# Altium footprint library pUFM_Digital_Interface_R0.1-PCB.PcbLib: 49 footprints (part 2 of 4)
Each footprint in its own frame and in the unit in brackets; x right, y up, seen from the top. Pads: shape width x height; smd on the part's side, far side on the other; paste and mask are expansions set on the pad; w line width, h text height; cw(c..) or ccw(c..) is an arc to the next point about the centre after c.
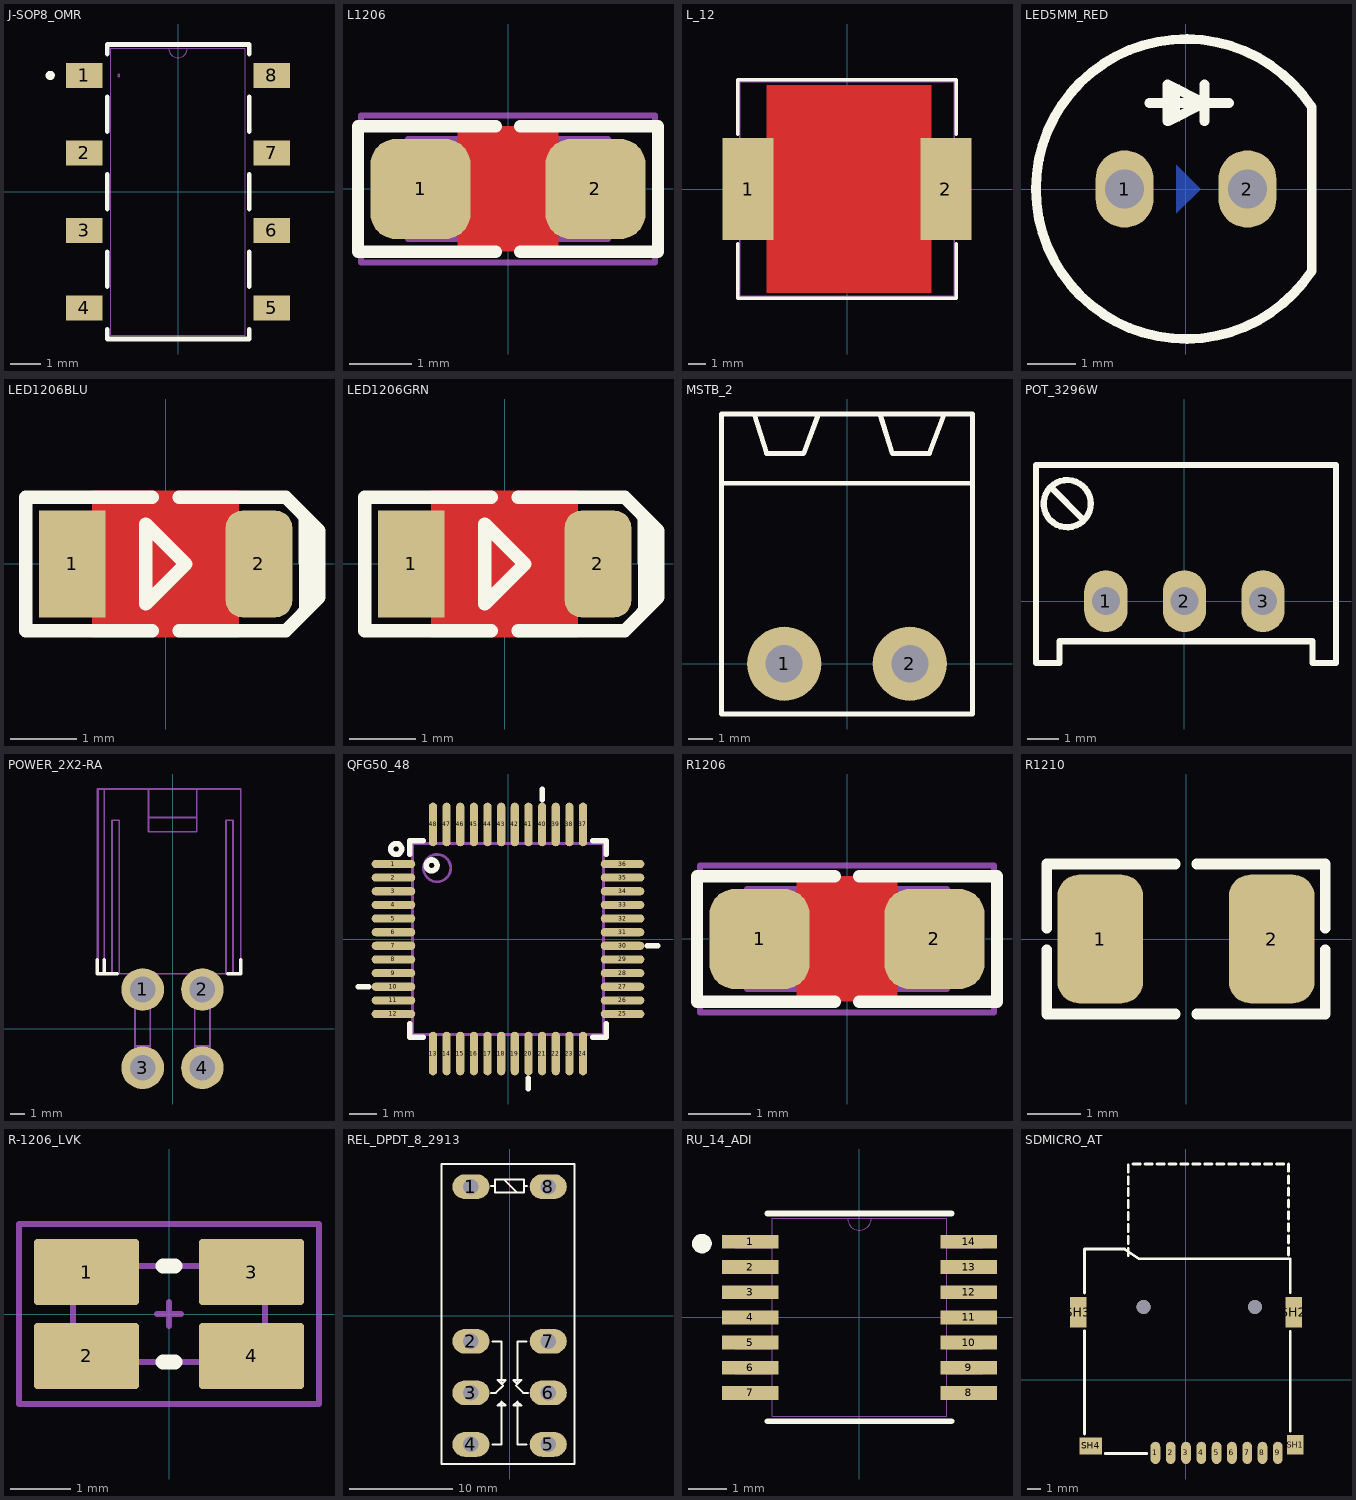
[diagram p1: the footprints below, top view; thin cyan lines are the x and y axes]

## J-SOP8_OMR [mil]
height 255.91
pads (8):
  rect 47x32 smd paste+0 mask+0: 1(-121.06,150) 2(-121.06,50) 3(-121.06,-50) 4(-121.06,-150) 5(121.06,-150) 6(121.06,-50) 7(121.06,50) 8(121.06,150)
Top Overlay:
  circle w6: c-165,150 r3
  lines w6: -91.61,-177.67 -91.61,-190.04 91.61,-190.04 91.61,-177.67 ; -91.61,-122.33 -91.61,-77.67 ; -91.61,-22.33 -91.61,22.33 ; -91.61,77.67 -91.61,122.33 ; -91.61,177.67 -91.61,190.04 91.61,190.04 91.61,177.67 ; 91.61,-122.33 91.61,-77.67 ; 91.61,-22.33 91.61,22.33 ; 91.61,77.67 91.61,122.33
Mechanical 13:
  circle w0: c-76.61,150 r1.5
  lines w0: -12,185.04 ccw(c0,185.04) 12,185.04
  lines w1: -86.61,-185.04 86.61,-185.04 86.61,185.04 -86.61,185.04 -86.61,-185.04
3D body "J-SOP8_OMR.step": height 91.1, standoff 0, extent -130.79,-185.04 130.79,185.04

## L1206 [mm] "INDUCTOR, FERRITE BEAD, 1206, 3.2X1.6mm"
height 2
pads (2):
  rrect50% 1.6x1.6 smd paste-0.1 mask+0.075: 1(-1.4,0) 2(1.4,0)
Top Layer:
  pour cut-out: -0.8,1 -0.8,-1 0.8,-1 0.8,1
Top Overlay:
  lines w0.2: -2.4,-1 -0.2,-1 ; -2.4,-1 -2.4,1 -0.2,1 ; 0.2,-1 2.4,-1 ; 0.2,1 2.4,1 2.4,-1
Mechanical 13:
  lines w0.1: -1.6,-0.8 -1.6,0.8 1.6,0.8 1.6,-0.8 -1.6,-0.8
Mechanical 15:
  lines w0.1: -0.5,0 0.5,0 ; 0,-0.5 0,0.5 ; -2.35,-1.175 -2.35,1.175 2.35,1.175 2.35,-1.175 -2.35,-1.175
3D body "User Library-ind_1206.step": height 1.1, standoff 0, extent -1.6,-0.8 1.6,0.8

## L_12 [mm] "INDUCTOR, 13.5x12.5mm, DR125, CDRH127, D128C 931AS"
height 7
pads (2):
  rect 3x6 smd paste-4: 1(-5.8,0) 2(5.8,0)
Top Layer:
  pour cut-out: -4.699,6.096 4.953,6.096 4.953,-6.096 -4.699,-6.096
Top Overlay:
  lines w0.2: -6.4,-3.2 -6.4,-6.4 6.4,-6.4 6.4,-3.2 ; -6.4,3.2 -6.4,6.4 6.4,6.4 6.4,3.2
Top Paste:
  rectangle: -6.9,-2.7 -4.5,-0.2
  rectangle: -6.9,0.2 -4.5,2.7
  region: 6.9,2.7 4.5,2.7 4.5,0.2 6.9,0.2
  region: 6.9,-0.2 4.5,-0.2 4.5,-2.7 6.9,-2.7
Mechanical 13:
  lines w0.1: -6.3,-6.3 6.3,-6.3 6.3,6.3 -6.3,6.3 -6.3,-6.3
3D body "User Library-D128C.step": height 8.16, standoff 0, extent -6.158,-6.15 6.158,6.15

## LED5MM_RED [mm] "LED THD 5MM RED"
height 6.5
pads (2):
  oval 1.2x1.6 hole 0.8: 1(-1.27,0) 2(1.27,0)
Bottom Layer:
  region: -0.2,0.5 -0.2,-0.5 0.3,0
Top Overlay:
  rectangle: -0.381,1.397 -0.127,2.159
  lines w0.2: -0.762,1.778 0.889,1.778 ; 0.381,1.397 0.381,2.159 ; 2.6,-1.7 2.6,1.7 ; 2.6,-1.688 cw(c0,0) 2.6,1.688 ; -0.381,1.397 -0.381,2.159 0.381,1.778 -0.381,1.397
3D body "LED-D5R.step": height 9.14, standoff -6.3, extent -3,-3 2.5,3

## LED1206BLU [mm] "LED, 1206, BLUE"
height 6.5
pads (2):
  rect 1x1.6 smd paste-0.2 mask+0.075: 1(-1.4,0)
  rrect50% 1x1.6 smd paste-0.2 mask+0.075: 2(1.4,0)
Top Layer:
  pour cut-out: -1.1,1.1 -1.1,-1.1 1.1,-1.1 1.1,1.1
Top Overlay:
  region: 2,0.7 2,-0.7 2.3,-0.4 2.3,0.4
  lines w0.2: -0.2,-1 -2.1,-1 -2.1,1 -0.2,1 ; 0.2,-1 1.8,-1 2.3,-0.5 2.3,0.5 1.8,1 0.2,1 ; -0.3,-0.6 0.3,0 -0.3,0.6 -0.3,-0.6
3D body "User Library-Wurth Elektronik WL-SMCW 1206 (3216) LED Lens (Separate Body).step": height 0.68, standoff 0.28, extent -1,-0.8 1,0.8
3D body "User Library-Wurth Elektronik WL-SMCW 1206 (3216) LED Base (Separate Lens).step": height 0.62, standoff 0, extent -1.6,-0.8 1.6,0.8

## LED1206GRN [mm] "LED, 1206, GREEN"
height 6.5
pads (2):
  rect 1x1.6 smd paste-0.2 mask+0.075: 1(-1.4,0)
  rrect50% 1x1.6 smd paste-0.2 mask+0.075: 2(1.4,0)
Top Layer:
  pour cut-out: -1.1,1.1 -1.1,-1.1 1.1,-1.1 1.1,1.1
Top Overlay:
  region: 2,0.7 2,-0.7 2.3,-0.4 2.3,0.4
  lines w0.2: -0.2,-1 -2.1,-1 -2.1,1 -0.2,1 ; 0.2,-1 1.8,-1 2.3,-0.5 2.3,0.5 1.8,1 0.2,1 ; -0.3,-0.6 0.3,0 -0.3,0.6 -0.3,-0.6
3D body "User Library-Wurth Elektronik WL-SMCW 1206 (3216) LED Lens (Separate Body).step": height 0.68, standoff 0.28, extent -1,-0.8 1,0.8
3D body "User Library-Wurth Elektronik WL-SMCW 1206 (3216) LED Base (Separate Lens).step": height 0.62, standoff 0, extent -1.6,-0.8 1.6,0.8

## MSTB_2 [mm] "PHOENIX MSTB 2, 5-G, 5.08mm pitch, 2pin"
height 6.5
pads (2):
  round 3 hole 1.5: 1(-2.54,0) 2(2.54,0)
Top Overlay:
  lines w0.2: -5.08,7.3 5.08,7.3 ; -3.75,10.1 -3.25,8.5 -1.75,8.5 -1.15,10.1 ; 1.33,10.1 1.83,8.5 3.33,8.5 3.93,10.1 ; -5.08,-2.032 5.08,-2.032 5.08,10.1 -5.08,10.1 -5.08,-2.032
3D body "PHOENIX_MSTB2.stp": height 8.7, standoff -3.4, extent -5,-2 5,10

## POT_3296W [mm] "POT, TRIM, 10.0X5.0mm, pitch: 2.5mm 3299W 3296W S64W"
height 6.5
pads (3):
  oval 1.4x2 / inner round 1.2 / far side oval 1.4x2 hole 0.9: 1(-2.54,0) 2(0,0) 3(2.54,0)
Top Overlay:
  circle w0.2: c-3.791,3.151 r0.762
  lines w0.2: -4.299,3.659 -3.283,2.643 ; -4.8,-2 -4.045,-2 -4.045,-1.3 4.145,-1.3 4.145,-2 4.9,-2 4.9,4.4 -4.8,4.4 -4.8,-2
3D body "pot 3299W-1-103RLF.step": height 11.56, standoff -6.22, extent -4.725,-1.848 4.8,4.248

## POWER_2X2-RA [mm] "TE Connectivity PE Series, 4.2mm Pitch 4 Way 2 Row Right Angle PCB Header, Solder Termination, 9A"
height 9.8
pads (4):
  round 3 hole 1.8: 1(-2.1,2.75) 2(2.1,2.75) 3(-2.1,-2.75) 4(2.1,-2.75)
Top Overlay:
  lines w0.254: -5.3,4.85 -5.3,3.85 -4.8,3.85 ; -4.8,4.85 -4.8,3.85 ; -3.9,3.85 -4.8,3.85 ; 3.9,3.85 4.8,3.85 4.8,4.85
Mechanical 15:
  lines w0.127: -4.25,3.85 -4.25,14.65 -3.75,14.65 -3.75,3.85 ; -2.635,-2.215 -1.565,-2.215 ; -2.635,3.285 -1.565,3.285 ; 1.565,-2.215 2.635,-2.215 ; 1.565,3.285 2.635,3.285 ; 3.75,3.85 3.75,14.65 4.25,14.65 4.25,3.85 ; -5.251,3.85 -5.3,3.85 -5.3,16.85 -5.251,16.85 ; -5.251,3.85 -5.251,16.85 ; -5.251,3.85 -5.251,16.85 ; -5.251,3.85 -4.8,3.85 ; -5.251,16.85 -4.8,16.85 ; -4.8,3.85 4.8,3.85 4.8,16.85 1.7,16.85 ; -4.8,3.85 -4.8,16.85 ; -4.8,16.85 -1.7,16.85 ; -2.635,-1.215 -1.565,-1.215 ; -2.635,-1.215 -2.635,-3.285 -1.565,-3.285 -1.565,-1.215 ; -2.635,-1.215 -2.635,3.85 -2.635,2.215 -1.565,2.215 -1.565,3.85 -1.565,-1.215 ; -2.635,-1.215 -1.565,-1.215 ; -1.7,14.851 -1.7,13.85 1.7,13.85 1.7,14.851 ; -1.7,14.851 1.7,14.851 ; -1.7,14.851 -1.7,16.85 ; -1.7,16.85 1.7,16.85 ; 1.565,-1.215 2.635,-1.215 ; 1.565,-1.215 1.565,-3.285 2.635,-3.285 2.635,-1.215 ; 1.565,-1.215 1.565,3.85 1.565,2.215 2.635,2.215 2.635,3.85 2.635,-1.215 ; 1.565,-1.215 2.635,-1.215 ; 1.7,14.851 1.7,16.85
3D body "PAD-18.ro30x30.stp": height 0.04, standoff 0, extent -3.6,-4.25 -0.6,-1.25
3D body "PAD-18.ro30x30.stp": height 0.04, standoff 0, extent 0.6,-4.25 3.6,-1.25
3D body "PAD-18.ro30x30.stp": height 0.04, standoff 0, extent -3.6,1.25 -0.6,4.25
3D body "PAD-18.ro30x30.stp": height 0.04, standoff 0, extent 0.6,1.25 3.6,4.25
3D body "POWER_2X2-RA.stp": height 11.69, standoff -3.11, extent -5.3,-3.285 4.8,16.85
3D body "PAD-18.ro30x30.stp": height 0.04, standoff 0, extent -3.6,1.25 -0.6,4.25
3D body "PAD-18.ro30x30.stp": height 0.04, standoff 0, extent 0.6,1.25 3.6,4.25
3D body "PAD-18.ro30x30.stp": height 0.04, standoff 0, extent -3.6,-4.25 -0.6,-1.25
3D body "PAD-18.ro30x30.stp": height 0.04, standoff 0, extent 0.6,-4.25 3.6,-1.25

## QFG50_48 [mm] "LQFP48, PQFF, PQFG, TSQFP, 48-Leads, Body 7.00x7.00mm, Pitch 0.50mm"
height 1.6
pads (48):
  oval 1.6x0.3 smd mask+0.05: 1(-4.2,2.75) 2(-4.2,2.25) 3(-4.2,1.75) 4(-4.2,1.25) 5(-4.2,0.75) 6(-4.2,0.25) 7(-4.2,-0.25) 8(-4.2,-0.75) 9(-4.2,-1.25) 10(-4.2,-1.75) 11(-4.2,-2.25) 12(-4.2,-2.75) 25(4.2,-2.75) 26(4.2,-2.25) 27(4.2,-1.75) 28(4.2,-1.25) 29(4.2,-0.75) 30(4.2,-0.25) 31(4.2,0.25) 32(4.2,0.75) 33(4.2,1.25) 34(4.2,1.75) 35(4.2,2.25) 36(4.2,2.75)
  oval 0.3x1.6 smd mask+0.05: 13(-2.75,-4.2) 14(-2.25,-4.2) 15(-1.75,-4.2) 16(-1.25,-4.2) 17(-0.75,-4.2) 18(-0.25,-4.2) 19(0.25,-4.2) 20(0.75,-4.2) 21(1.25,-4.2) 22(1.75,-4.2) 23(2.25,-4.2) 24(2.75,-4.2) 37(2.75,4.2) 38(2.25,4.2) 39(1.75,4.2) 40(1.25,4.2) 41(0.75,4.2) 42(0.25,4.2) 43(-0.25,4.2) 44(-0.75,4.2) 45(-1.25,4.2) 46(-1.75,4.2) 47(-2.25,4.2) 48(-2.75,4.2)
Top Overlay:
  circle w0.2: c-2.8,2.7 r0.2
  circle w0.2: c-4.1,3.3 r0.2
  lines w0.2: -5.5,-1.75 -5.1,-1.75 ; -3.6,-3.1 -3.6,-3.6 -3.1,-3.6 ; -3.6,3.1 -3.6,3.6 -3.1,3.6 ; 0.75,-5.5 0.75,-5.1 ; 1.25,5.1 1.25,5.5 ; 3.1,-3.6 3.6,-3.6 3.6,-3.1 ; 3.1,3.6 3.6,3.6 3.6,3.1 ; 5.1,-0.25 5.5,-0.25
Mechanical 13:
  circle w0.1: c-2.6,2.6 r0.5
  lines w0.1: -3.5,-3.5 3.5,-3.5 3.5,3.5 -3.5,3.5 -3.5,-3.5
3D body "LQFP48_Grid_0_5.STEP": height 1.6, standoff 0, extent -4.5,-4.5 4.5,4.5

## R1206 [mm] "CHIP RESISTOR 1/4 WATT, Body 3.2x1.6mm,1206, 3216"
height 2
pads (2):
  rrect50% 1.6x1.6 smd paste-0.1 mask+0.075: 1(-1.4,0) 2(1.4,0)
Top Layer:
  pour cut-out: -0.8,1 -0.8,-1 0.8,-1 0.8,1
Top Overlay:
  lines w0.2: -2.4,-1 -0.2,-1 ; -2.4,-1 -2.4,1 -0.2,1 ; 0.2,-1 2.4,-1 ; 0.2,1 2.4,1 2.4,-1
Mechanical 13:
  lines w0.1: -1.6,-0.8 -1.6,0.8 1.6,0.8 1.6,-0.8 -1.6,-0.8
Mechanical 15:
  lines w0.1: -0.5,0 0.5,0 ; 0,-0.5 0,0.5 ; -2.35,-1.175 -2.35,1.175 2.35,1.175 2.35,-1.175 -2.35,-1.175
3D body "User Library-RES_3216-1206.step": height 0.85, standoff 0, extent -1.675,-0.865 1.675,0.865

## R1210 [mm] "CHIP RESISTOR 1/2 WATT, Body 3.2x2.5mm,1210, 3225"
height 0.7
pads (2):
  rrect50% 1.6x2.4 smd paste-0.2 mask+0.075: 1(-1.6,0) 2(1.6,0)
Top Overlay:
  lines w0.2: -2.6,-0.2 -2.6,-1.4 -0.2,-1.4 ; -2.6,0.2 -2.6,1.4 -0.2,1.4 ; 0.2,-1.4 2.6,-1.4 2.6,-0.2 ; 0.2,1.4 2.6,1.4 2.6,0.2
3D body "RES 1210 (3225 metric).STEP": height 0.69, standoff -0.01, extent -1.7,-1.35 1.7,1.35

## R-1206_LVK [mm] "LVK12 (1206),3.2mm x 1.6mm x 0.50mm (LxWxH)"
height 0.5
pads (4):
  rrect10% 1.75x1.1 smd: 1(-1.375,0.7) 2(-1.375,-0.7) 3(1.375,0.7) 4(1.375,-0.7)
Top Overlay:
  lines w0.254: -0.102,-0.8 0.102,-0.8 ; -0.102,0.8 0.102,0.8
Mechanical 11:
  lines w0.1: -0.203,0 0,0 ; 0,-0.203 0,0 ; 0,0.203 0,0 ; 0.203,0 0,0 ; -1.6,-0.8 -1.6,0.8 1.6,0.8 1.6,-0.8 -1.6,-0.8
Mechanical 15:
  lines w0.1: -0.203,0 0,0 ; 0,-0.203 0,0 ; 0,0.203 0,0 ; 0.203,0 0,0 ; -2.5,-1.5 -2.5,1.5 2.5,1.5 2.5,-1.5 -2.5,-1.5
3D body "R-1206_LVK.stp": height 0.55, standoff 0, extent -1.6,-0.8 1.6,0.8
3D body: height 0.04, standoff 0, extent -2.25,0.15 -0.5,1.25
3D body: height 0.04, standoff 0, extent -2.25,-1.25 -0.5,-0.15
3D body: height 0.04, standoff 0, extent 0.5,-1.25 2.25,-0.15
3D body: height 0.04, standoff 0, extent 0.5,0.15 2.25,1.25

## REL_DPDT_8_2913 [mm] "RELAY, DPDT, 8P, 2.54mm pitch, 29X13mm, G2R-2C, HHC69A, NNC69A, JQX-14FC"
height 6.5
pads (8):
  oval 3.6x2.4 hole 1.5: 1(-3.75,12.5) 2(-3.75,-2.5) 3(-3.75,-7.5) 4(-3.75,-12.5) 5(3.75,-12.5) 6(3.75,-7.5) 7(3.75,-2.5) 8(3.75,12.5)
Top Overlay:
  lines w0.2: -1.8,-7.5 -1.33,-7.5 -0.635,-6.805 ; -1.8,12.556 -1.397,12.556 ; -1.651,-12.5 -0.762,-12.5 -0.762,-8.349 ; -1.651,-2.5 -0.762,-2.5 -0.762,-6.651 ; -0.508,13.191 0.762,11.921 ; 0.635,-6.805 1.33,-7.5 1.8,-7.5 ; 1.397,12.556 1.7,12.556 ; 1.651,-12.5 0.762,-12.5 0.762,-8.349 ; 1.651,-2.5 0.762,-2.5 0.762,-6.651 ; -0.762,-8.349 -1.143,-8.73 -0.381,-8.73 -0.762,-8.349 ; -0.762,-6.651 -0.381,-6.27 -1.143,-6.27 -0.762,-6.651 ; 0.762,-8.349 1.143,-8.73 0.381,-8.73 0.762,-8.349 ; 0.762,-6.651 0.381,-6.27 1.143,-6.27 0.762,-6.651 ; -6.6,-14.4 -6.6,14.7 6.3,14.7 6.3,-14.4 -6.6,-14.4 ; -1.397,11.921 1.397,11.921 1.397,13.191 -1.397,13.191 -1.397,11.921
3D body "User Library-OMRON G2R-2 RELAY.STEP": height 25.46, standoff -4.51, extent -6.5,-14.328 6.225,14.628

## RU_14_ADI [mil]
height 255.91
pads (14):
  rect 57.56x13.97 smd paste+0 mask+0: 1(-111,76.77) 2(-111,51.18) 3(-111,25.59) 4(-111,0) 5(-111,-25.59) 6(-111,-51.18) 7(-111,-76.77) 8(111,-76.77) 9(111,-51.18) 10(111,-25.59) 11(111,0) 12(111,25.59) 13(111,51.18) 14(111,76.77)
Top Overlay:
  circle w10: c-160,75 r5
  lines w6: -93.5,-105.5 93.5,-105.5 ; -93.5,105.5 93.5,105.5
Mechanical 13:
  lines w0: -12,100.5 ccw(c0,100.5) 12,100.5
  lines w1: -126,-82.77 -126,-70.77 -88.5,-70.77 -88.5,-82.77 -126,-82.77 ; -126,-57.18 -126,-45.18 -88.5,-45.18 -88.5,-57.18 -126,-57.18 ; -126,-31.59 -126,-19.59 -88.5,-19.59 -88.5,-31.59 -126,-31.59 ; -126,-6 -126,6 -88.5,6 -88.5,-6 -126,-6 ; -126,19.59 -126,31.59 -88.5,31.59 -88.5,19.59 -126,19.59 ; -126,45.18 -126,57.18 -88.5,57.18 -88.5,45.18 -126,45.18 ; -126,70.77 -126,82.77 -88.5,82.77 -88.5,70.77 -126,70.77 ; -88.5,-100.5 88.5,-100.5 88.5,100.5 -88.5,100.5 -88.5,-100.5 ; 88.5,-82.77 88.5,-70.77 126,-70.77 126,-82.77 88.5,-82.77 ; 88.5,-57.18 88.5,-45.18 126,-45.18 126,-57.18 88.5,-57.18 ; 88.5,-31.59 88.5,-19.59 126,-19.59 126,-31.59 88.5,-31.59 ; 88.5,-6 88.5,6 126,6 126,-6 88.5,-6 ; 88.5,19.59 88.5,31.59 126,31.59 126,19.59 88.5,19.59 ; 88.5,45.18 88.5,57.18 126,57.18 126,45.18 88.5,45.18 ; 88.5,70.77 88.5,82.77 126,82.77 126,70.77 88.5,70.77
3D body "RU_14_ADI.step": height 47.09, standoff 0, extent -125.98,-100.51 125.98,100.51

## SDMICRO_AT [mm] "SDMICRO exist on Iran, Attend 112J-TDAR-R01 push-push"
height 1
pads (15):
  oval 0.7x1.6 smd: 1(-2.2,-5.25) 2(-1.1,-5.25) 3(0,-5.25) 4(1.1,-5.25) 5(2.2,-5.25) 6(3.3,-5.25) 7(4.4,-5.25) 8(5.5,-5.25) 9(6.6,-5.25)
  rect 1.2x1.4 smd: SH1(7.85,-4.65)
  rect 1.2x2.2 smd: SH2(7.75,4.85) SH3(-7.75,4.85)
  rect 1.6x1.2 smd: SH4(-6.85,-4.75)
  round 1 hole 1 unplated: ""(-3.05,5.25) ""(4.95,5.25)
Top Overlay:
  lines w0.2: -7.3,-3.9 -7.3,3.53 ; -7.3,6.25 -7.3,9.4 -4.409,9.4 -3.399,8.7 7.5,8.7 7.5,6.26 ; -5.8,-5.3 -2.82,-5.3 ; -4.16,8.93 -4.16,9.45 ; -4.16,9.79 -4.16,10.31 ; -4.16,10.65 -4.16,11.17 ; -4.16,11.51 -4.16,12.03 ; -4.16,12.37 -4.16,12.89 ; -4.16,13.23 -4.16,13.75 ; -4.16,14.09 -4.16,14.61 ; -4.16,14.95 -4.16,15.47 ; -3.81,15.52 -3.29,15.52 ; -2.95,15.52 -2.43,15.52 ; -2.09,15.52 -1.57,15.52 ; -1.23,15.52 -0.71,15.52 ; -0.37,15.52 0.15,15.52 ; 0.49,15.52 1.01,15.52 ; 1.35,15.52 1.87,15.52 ; 2.21,15.52 2.73,15.52 ; 3.07,15.52 3.59,15.52 ; 3.93,15.52 4.45,15.52 ; 4.79,15.52 5.31,15.52 ; 5.65,15.52 6.17,15.52 ; 6.51,15.52 7.03,15.52 ; 7.37,8.98 7.37,9.5 ; 7.37,9.84 7.37,10.36 ; 7.37,10.7 7.37,11.22 ; 7.37,11.56 7.37,12.08 ; 7.37,12.42 7.37,12.94 ; 7.37,13.28 7.37,13.8 ; 7.37,14.14 7.37,14.66 ; 7.37,15 7.37,15.52 ; 7.5,-3.7 7.5,3.5
3D body "User Library-Micro_SD.step": height 1.15, standoff 0.17, extent -3.976,-1.179 7.024,13.821
3D body "112J-TXAR-R_C_1.stp": height 1.85, standoff -0.6, extent -8,-5.702 8.1,9.3